# Altium footprint library Footprints_SOC.PcbLib: 199 footprints (part 8 of 13)
Each footprint in its own frame and in the unit in brackets; x right, y up, seen from the top. Pads: shape width x height; smd on the part's side, far side on the other; paste and mask are expansions set on the pad; w line width, h text height; cw(c..) or ccw(c..) is an arc to the next point about the centre after c.
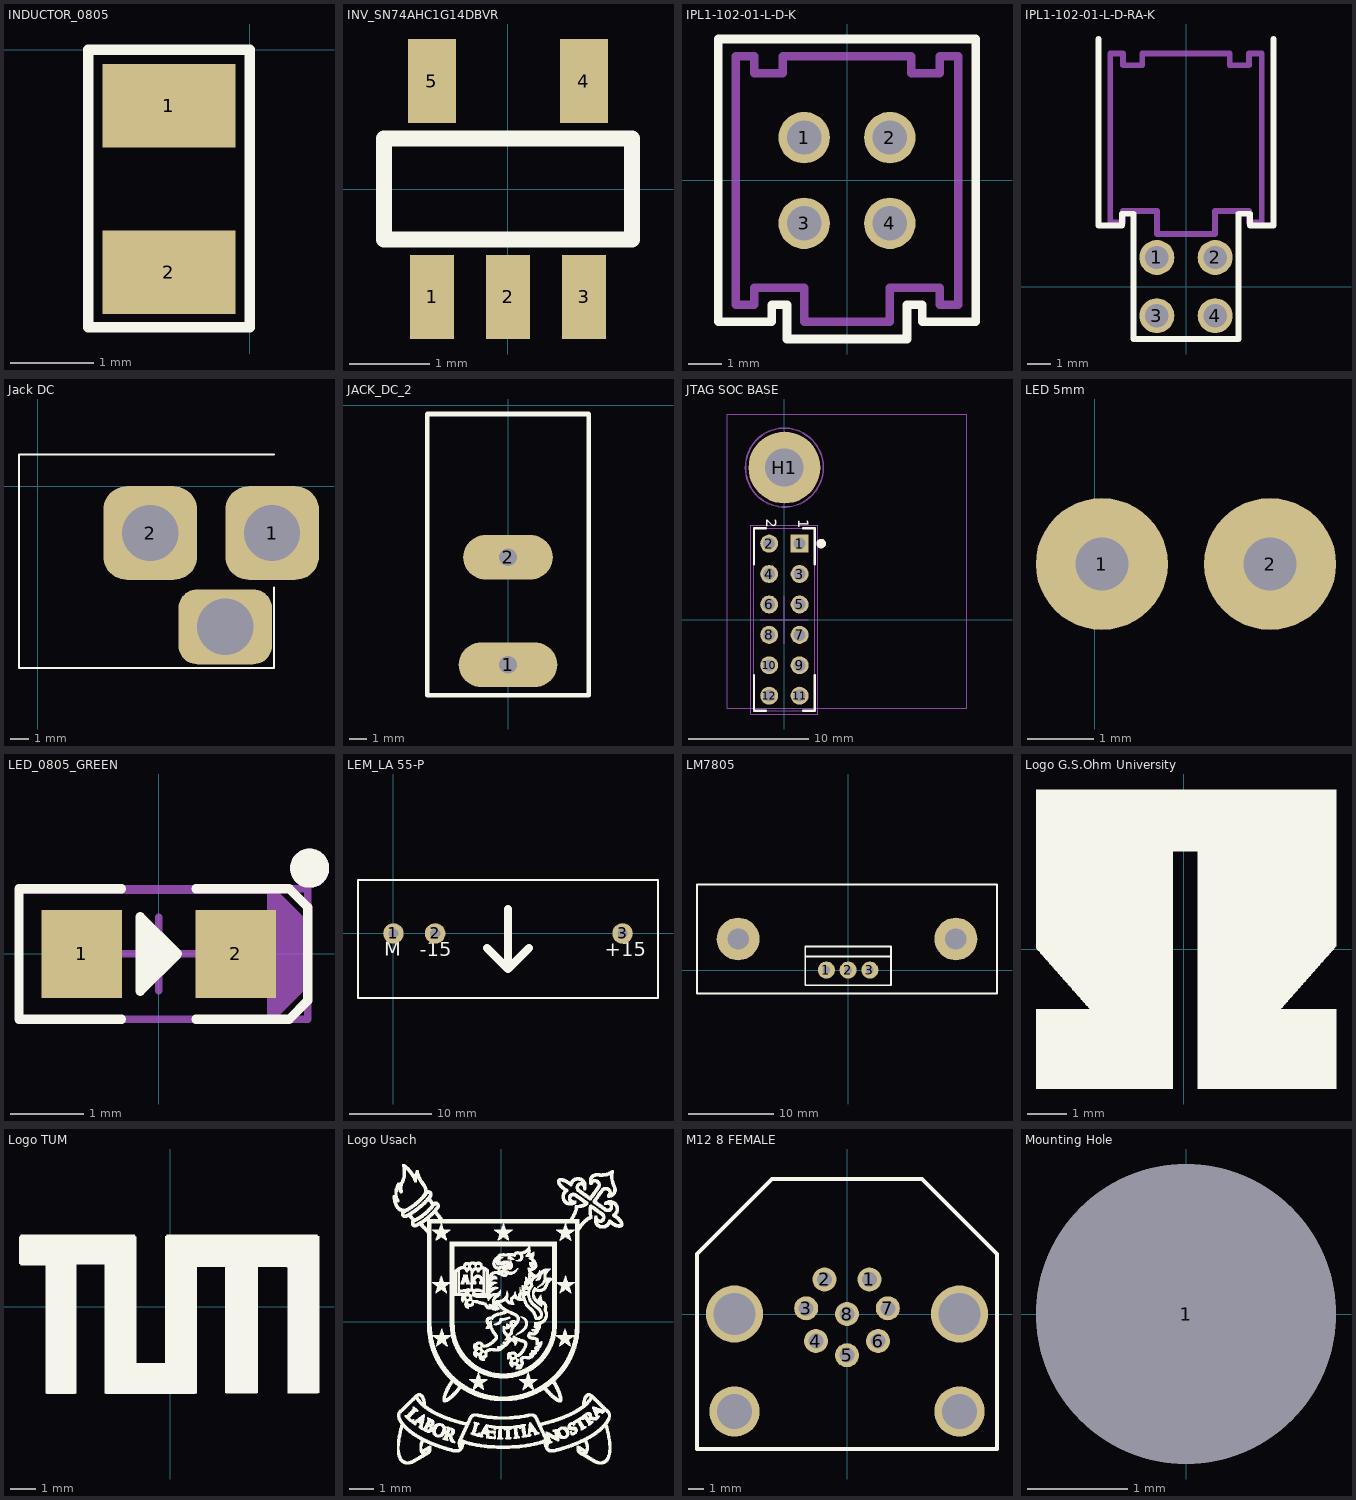
[diagram p7: the footprints below, top view; thin cyan lines are the x and y axes]

## INDUCTOR_0805 [mm] "Wurth"
pads (2):
  rect 1.6x1 smd: 1(-0.97,-0.67) 2(-0.97,-2.67)
Top Overlay:
  lines w0.127: -1.94,-3.33 -1.94,0 0,0 0,-3.33 -1.94,-3.33
3D body "inductor 0805 wurth.stp": height 1, standoff 0, extent -1.57,-2.67 -0.37,-0.67

## INV_SN74AHC1G14DBVR [mm] "IC SCHMITT-TRG INV GATE SOT23-5"
height 1.45
pads (5):
  rect 0.55x1.05 smd mask+0.07: 1(-0.95,-1.35) 2(0,-1.35) 3(0.95,-1.35)
  rect 0.6x1.05 smd mask+0.1: 4(0.95,1.35) 5(-0.95,1.35)
Top Overlay:
  lines w0.2: -1.55,-0.63 1.55,-0.63 1.55,0.63 -1.55,0.63 -1.55,-0.63
3D body "SOT23-5.stp": height 1.2, standoff 0.02, extent -1.5,-1.418 1.5,1.418

## IPL1-102-01-L-D-K [mil]
pads (4):
  round 60 hole 40 mask+3: 1(-50,50) 2(50,50) 3(-50,-50) 4(50,-50)
Top Overlay:
  lines w10: -95,165 95,165 ; -88,165 -150,165 -150,-165 -88,-165 -88,-145 -70,-145 -70,-185 70,-185 70,-145 88,-145 88,-165 150,-165 150,165 88,165
Mechanical 5:
  lines w10: -130,-145 -108,-145 -108,-125 -50,-125 -50,-165 50,-165 50,-125 108,-125 108,-145 130,-145 130,145 108,145 108,125 75,125 75,145 -75,145 -75,125 -108,125 -108,145 -130,145 -130,-145
  text ".Designator" at -19.68,-19.68 h30
3D body "IPL1-102-01-F-D-K.stp": height 320, standoff -120, extent -130,-165 130,145

## IPL1-102-01-L-D-RA-K [mil]
pads (4):
  round 60 hole 40 mask+3: 1(-50,50) 2(50,50) 3(-50,-50) 4(50,-50)
Top Overlay:
  lines w10: -150,425 -150,125 -150,105 -110,105 -110,125 -90,125 -90,-90 90,-90 90,125 110,125 110,105 150,105 150,125 150,425
Mechanical 5:
  lines w10: -130,110 -108,110 -108,130 -50,130 -50,90 50,90 50,130 108,130 108,110 130,110 130,400 108,400 108,380 75,380 75,400 -75,400 -75,380 -108,380 -108,400 -130,400 -130,110
  text ".Designator" at -19.68,-19.68 h30
3D body "IPL1-102-01-L-D-RA-K.stp": height 315, standoff -80, extent -129.99,-62.49 130.01,430.01

## Jack DC [mm]
pads (3):
  rrect50% 5x5 hole 3: 1(12.5,-2.5) 2(6,-2.5)
  rrect50% 5x4 hole 3: ""(10,-7.5)
Top Overlay:
  lines w0.1: 12.6,-5.4 12.6,-9.7 -1,-9.7 -1,1.7 12.6,1.7
3D body "Jack DC_10A_Hembra.step": height 11.3, standoff -3.2, extent -1,-7.9 13.1,1.7

## JACK_DC_2 [mm] "Conector alimentacion externa"
pads (2):
  oval 5.5x2.5 hole 1 square: 1(0,-14.5)
  oval 5x2.5 hole 1 square: 2(0,-8.5)
Top Overlay:
  lines w0.254: -4.5,-16.2 4.5,-16.2 4.5,-0.5 -4.5,-0.5 -4.5,-16.2
3D body "Jack DC CUI 5A 2 Terminales.step": height 11, standoff -3.5, extent -4.45,-15.22 4.55,-0.72

## JTAG SOC BASE [mm]
height 15
pads (13):
  rect 1.5x1.5 hole 1: 1(1.27,6.35)
  round 1.5 hole 1: 2(-1.27,6.35) 3(1.27,3.81) 4(-1.27,3.81) 5(1.27,1.27) 6(-1.27,1.27) 7(1.27,-1.27) 8(-1.27,-1.27) 9(1.27,-3.81) 10(-1.27,-3.81) 11(1.27,-6.35) 12(-1.27,-6.35)
  round 6 hole 3.2: H1(0,12.7)
Top Overlay:
  circle w0.4: c3.07,6.35 r0.2
  lines w0.2: -2.54,-4.62 -2.54,-7.62 -1.56,-7.62 ; -2.54,4.62 -2.54,7.62 -1.56,7.62 ; 1.56,-7.62 2.54,-7.62 2.54,-4.62 ; 1.56,7.62 2.54,7.62 2.54,4.62
  text "1" at 0.88,8.4 h1.52
  text "2" at -1.8,8.44 h1.52
Mechanical 11:
  lines w0.1: -4.78,-7.38 15.24,-7.38 15.24,17.174 -4.78,17.174 -4.78,-7.38
Mechanical 13:
  circle w0.1: c0,12.7 r1.6
  circle w0.1: c0,12.7 r3.25
  lines w0.1: -2.54,-7.62 2.54,-7.62 2.54,7.62 -2.54,7.62 -2.54,-7.62
  text "11" at 1,-5.23 h1
  text "12" at -2,-5.23 h1
  text "2" at -2,6.73 h1
  text "1" at 1,6.73 h1
  text ".Designator" at -1.45,-0.525 h1
Mechanical 14:
  circle w0.1: c0,12.7 r3.25
  circle w0.1: c0,12.7 r1.6
Mechanical 15:
  circle w0.05: c0,12.7 r3.3
  lines w0.05: -2,0 2,0 ; -1,12.7 1,12.7 ; 0,-2 0,2 ; 0,11.7 0,13.7 ; -2.8,-7.88 2.8,-7.88 2.8,7.88 -2.8,7.88 -2.8,-7.88
Mechanical 16:
  circle w0.05: c0,12.7 r3.3
3D body "female_header_a-bl254-dg-g12d.stp": height 8.5, standoff -3.2, extent -2.5,-7.745 2.5,7.745
3D body "TE0790-01.step": height 14.23, standoff 2.57, extent -4.78,-7.62 15.24,18.697

## LED 5mm [mm]
pads (2):
  round 2 hole 0.8: 1(0.11,-2.71) 2(2.66,-2.71)
3D body "Led verde 5mm.step": height 3.5, standoff 0.01, extent -0.643,-3.135 3.343,5.425

## LED_0805_GREEN [mm] "Chip LED, 2-Leads, Body 2.0x1.3mm, IPC Medium Density"
height 0.8
pads (2):
  rect 1.1x1.2 smd: 1(-1.05,0) 2(1.05,0)
Top Overlay:
  circle w0.279: c2.057,1.168 r0.127
  lines w0.127: -0.508,-0.889 -1.905,-0.889 -1.905,0.889 -0.508,0.889 ; -0.127,-0.381 -0.127,0.381 ; 0,-0.254 0,0.254 ; 0.127,-0.127 0.127,0.127 ; 0.508,-0.889 1.778,-0.889 2.032,-0.635 2.032,0.635 1.778,0.889 0.508,0.889 ; -0.254,-0.508 0.254,0 -0.254,0.508 -0.254,-0.508
Mechanical 5:
  circle w0.279: c2.057,1.168 r0.127
  lines w0.1: 1.524,0.864 1.524,-0.889 ; 1.524,-0.889 2.032,-0.381 2.032,0.381 1.549,0.864 1.143,0.864 -1.905,0.864 -1.905,-0.889 1.143,-0.889 1.524,-0.889
  lines w0.127: 1.575,-0.737 1.803,-0.508 ; 1.575,0.737 1.803,0.508
  lines w0.254: 1.651,-0.61 1.651,0.635 ; 1.88,-0.406 1.88,0.406
  text ".Designator" at -1.778,-0.44 h1.27
Mechanical 15:
  lines w0.1: -0.5,0 0.5,0 ; 0,-0.5 0,0.5 ; -1.905,-0.889 -1.905,0.889 2.032,0.889 2.032,-0.889 -1.905,-0.889
3D body "WL-SMCW_0805_LED.stp": height 0.68, standoff -0.02, extent -1,-0.625 1,0.625

## LEM_LA 55-P [mm] "SENSOR CURRENT 50A TH"
pads (3):
  round 2.5 hole 1.25: 1(0,0) 2(5.08,0) 3(27.94,0)
Top Overlay:
  lines w0.25: -4.33,-7.9 32.27,-7.9 32.27,6.55 -4.33,6.55 -4.33,-7.9
  lines w1: 11.4,-1.765 13.97,-4.335 ; 13.97,2.985 13.97,-4.335 ; 16.54,-1.765 13.97,-4.335
  text "+15" at 25.8,-3.36 h3
  text "-15" at 3.206,-3.36 h3
  text "M" at -1.11,-3.348 h3
3D body: height 14.9, standoff 7.9, extent 20.32,-7.9 32.27,6.55
3D body: height 14.9, standoff 7.9, extent -4.33,-7.9 7.62,6.55
3D body: height 7.9, standoff 0, extent -4.33,-7.9 32.27,6.55
3D body: height 1.2, standoff -4.5, extent 27.444,-0.499 28.44,0.499
3D body: height 1.2, standoff -4.5, extent 4.584,-0.499 5.58,0.499
3D body: height 1.2, standoff -4.5, extent -0.496,-0.499 0.5,0.499
3D body: height 27.2, standoff 14.9, extent -4.33,-7.9 32.27,6.55

## LM7805 [mm] "TO220 con disipador"
pads (5):
  round 2 hole 0.9: 1(-2.54,0) 2(0,0) 3(2.54,0)
  round 5 hole 2.5: ""(-12.829,3.625) ""(12.571,3.625)
Top Overlay:
  lines w0.2: -17.629,9.964 -17.629,-2.725 17.369,-2.725 17.369,9.974 -17.629,9.974 ; -4.999,1.575 5.001,1.575 ; -5,-1.76 5,-1.76 5,2.758 -5,2.758 -5,-1.76
3D body "Disipador TO-220 (CUI_HSE-B20254-035H-02).step": height 25.4, standoff -3.5, extent -17.629,-2.725 17.369,9.974
3D body "TO-220 Vertical.step": height 21.04, standoff 0.31, extent -5,-1.76 5,2.758

## Logo G.S.Ohm University [mm] "9.5 x 12.6 mm"
Top Overlay:
  drawing of 886 lines, arcs and shapes, not listed

## Logo TUM [mm] "9.5 x 12.6 mm"
Top Overlay:
  drawing of 3592 lines, arcs and shapes, not listed

## Logo Usach [mm] "9.5 x 12.6 mm"
Top Overlay:
  drawing of 9141 lines, arcs and shapes, not listed

## M12 8 FEMALE [mm]
pads (12):
  round 1.6 hole 1: 1(1.498,2.306) 2(-1.498,2.306) 3(-2.723,0.383) 4(-2.075,-1.804) 5(0,-2.75) 6(2.075,-1.804) 7(2.723,0.383) 8(0,0)
  round 3.35 hole 2.35: ""(-7.5,-6.5) ""(7.5,-6.5)
  round 3.8 hole 2.8: ""(-7.5,0) ""(7.5,0)
Top Overlay:
  lines w0.254: -10,-9 10,-9 10,0 10,4 5,9 0,9 -5,9 -10,4 -10,0 -10,-9
3D body "c-5-2172071-2-a-3d.stp": height 24, standoff -3.54, extent -9.75,-8.5 9.75,7.5

## Mounting Hole [mm] "3mm"
pads (1):
  round 3 hole 3 unplated mask+0: 1(0,0)